# Altium footprint library Transformers.PcbLib: 80 footprints (part 1 of 6)
Each footprint in its own frame and in the unit in brackets; x right, y up, seen from the top. Pads: shape width x height; smd on the part's side, far side on the other; paste and mask are expansions set on the pad; w line width, h text height; cw(c..) or ccw(c..) is an arc to the next point about the centre after c.
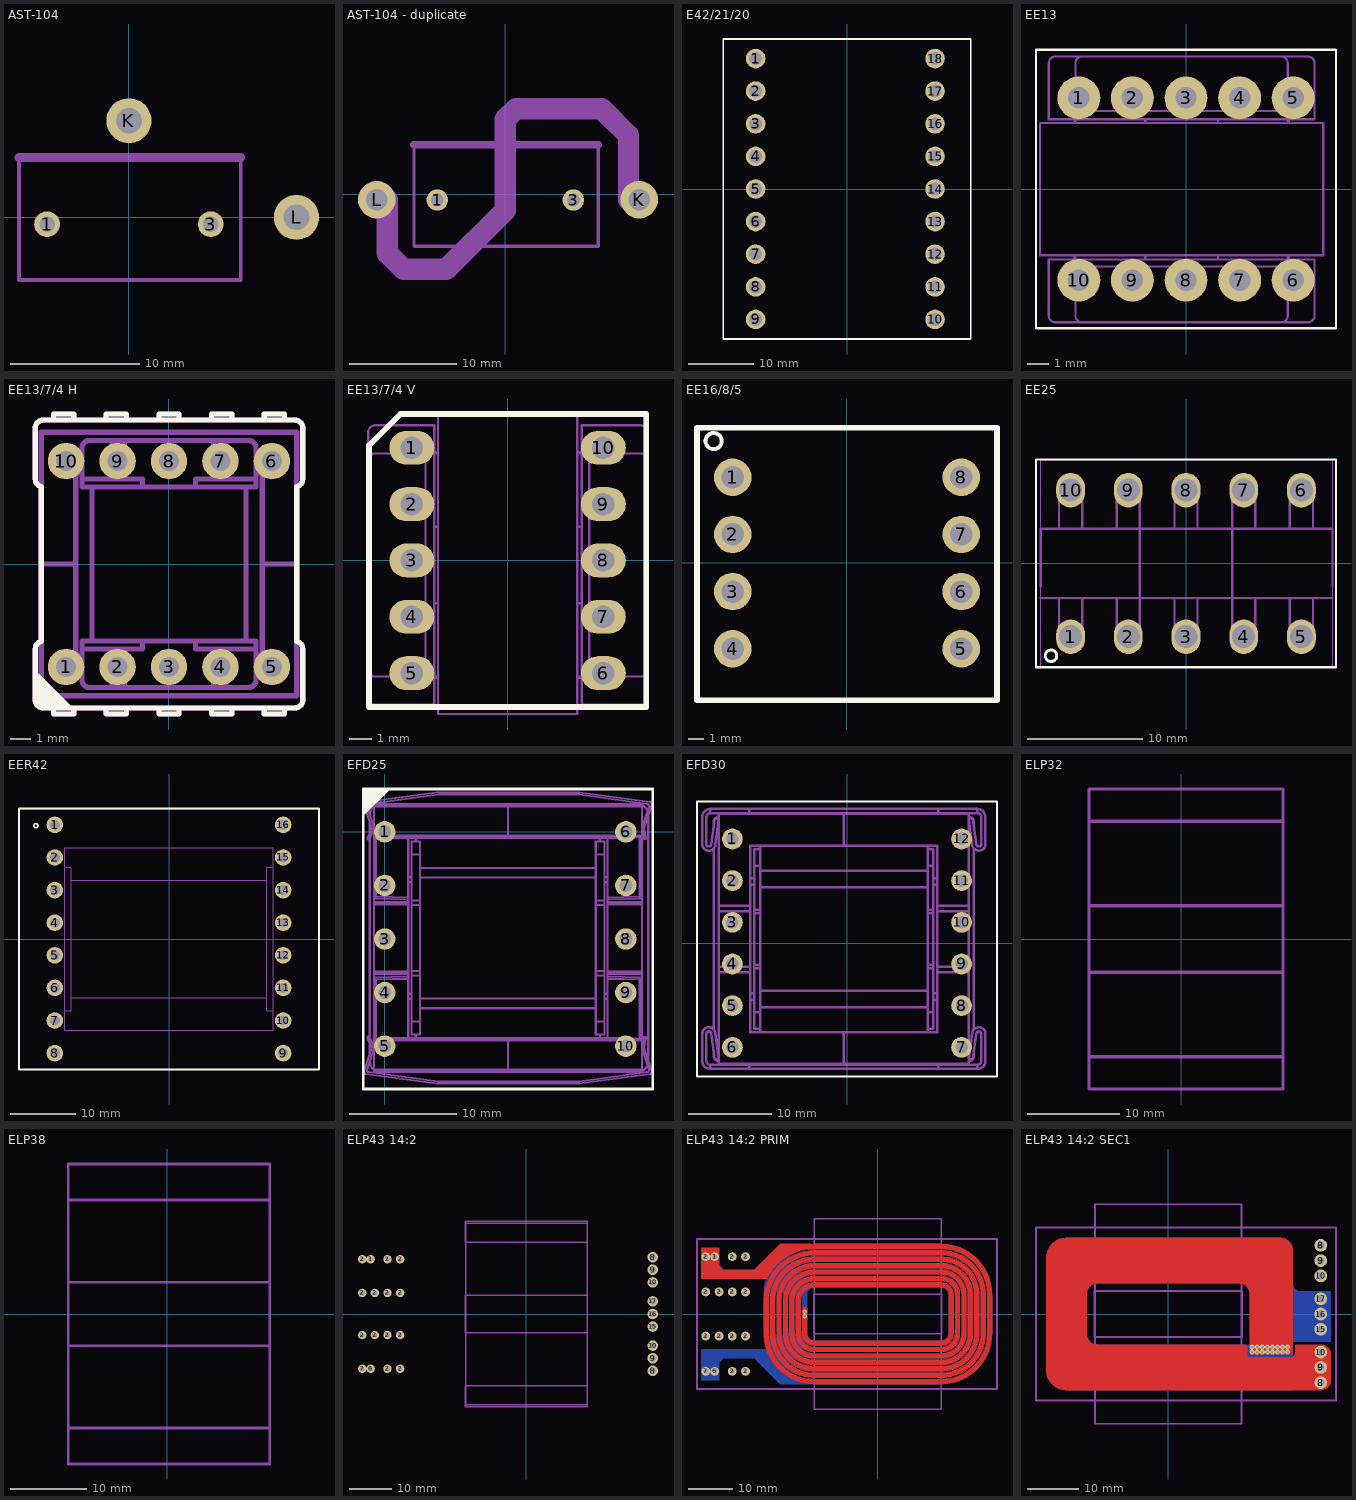
[diagram p0: the footprints below, top view; thin cyan lines are the x and y axes]

## AST-104 [mm]
pads (4):
  round 2 hole 1.2: 1(-6.35,-0.53) 3(6.35,-0.53)
  round 3.5 hole 2: K(0,7.5) L(13,0)
Mechanical 13:
  lines w0.3: -8.525,4.649 -8.525,-4.851 8.675,-4.851 8.675,4.65
  lines w0.7: -8.525,4.65 8.675,4.65
3D body "46722.stp": height 23.6, standoff -0.8, extent -8.526,-4.851 8.674,4.649

## AST-104 - duplicate [mm]
pads (4):
  round 2 hole 1.2: 1(-6.35,-0.53) 3(6.35,-0.53)
  round 3.5 hole 2: K(12.5,-0.5) L(-12,-0.5)
Mechanical 13:
  lines w0.3: -8.525,4.649 -8.525,-4.851 8.675,-4.851 8.675,4.65
  lines w0.7: -8.525,4.65 8.675,4.65
  lines w2: -11,-0.5 -11,-5.5 -9.5,-7 -5.5,-7 0,-1.5 0,7 1,8 9,8 11.5,5.5 11.5,-0.5
3D body "46722.stp": height 23.6, standoff -0.8, extent -8.526,-4.851 8.674,4.649

## E42/21/20 [mm]
pads (18):
  round 3 hole 2: 1(-14,20) 2(-14,15) 3(-14,10) 4(-14,5) 5(-14,0) 6(-14,-5) 7(-14,-10) 8(-14,-15) 9(-14,-20) 10(13.5,-20) 11(13.5,-15) 12(13.5,-10) 13(13.5,-5) 14(13.5,0) 15(13.5,5) 16(13.5,10) 17(13.5,15) 18(13.5,20)
Top Overlay:
  lines w0.254: -19,-23 19,-23 19,23 -19,23 -19,-23
3D body "E42_20-K-V-18P-SS-YW185_zÈo-enie.STEP": height 50.85, standoff -2.45, extent -18.5,-22.65 18.5,22.65

## EE13 [mm]
pads (10):
  round 2 hole 1 unplated paste-25.4: 1(-5,4.25) 2(-2.5,4.25) 3(0,4.25) 4(2.5,4.25) 5(5,4.25) 6(5,-4.25) 7(2.5,-4.25) 8(0,-4.25) 9(-2.5,-4.25) 10(-5,-4.25)
Top Overlay:
  lines w0.1: -7,-6.5 7,-6.5 7,6.5 -7,6.5 -7,-6.5
Mechanical 13:
  lines w0.1: -5.203,-3.092 -5.203,-3.294 -6.403,-3.294 -6.403,-5.919 ccw(c-6.103,-5.919) -6.103,-6.219 -4.853,-6.219 ; -5.203,3.082 -5.203,3.256 -6.403,3.256 -6.403,5.881 cw(c-6.103,5.881) -6.103,6.181 -4.853,6.181 ; -5.153,-3.092 -5.153,-3.294 ; -5.153,3.082 -5.153,3.256 ; -1.903,-3.294 -1.903,-3.092 ; -1.903,3.082 -1.903,3.255 ; 1.497,-3.294 1.497,-3.092 ; 1.497,3.082 1.497,3.255 ; 4.747,-3.092 4.747,-3.294 ; 4.747,3.082 4.747,3.255 ; 4.797,-3.092 4.797,-3.294 5.997,-3.294 5.997,-5.919 cw(c5.697,-5.919) 5.697,-6.219 4.447,-6.219 ; 4.797,3.082 4.797,3.256 5.997,3.256 5.997,5.881 ccw(c5.697,5.881) 5.697,6.181 4.447,6.181 ; -5.153,-3.625 4.747,-3.625 ; -5.153,-3.625 -5.153,-5.919 ccw(c-4.853,-5.919) -4.853,-6.219 ; -5.153,-3.625 -5.153,-3.294 ; -5.153,-3.294 4.747,-3.294 ; -5.153,3.256 -1.903,3.256 ; -5.153,3.256 -5.153,3.644 ; -5.153,3.644 4.747,3.644 ; -5.153,3.644 -5.153,5.881 cw(c-4.853,5.881) -4.853,6.181 ; -4.853,-6.219 4.447,-6.219 ; -4.853,6.181 4.447,6.181 ; -1.903,3.256 1.497,3.256 ; 1.497,3.255 4.747,3.255 ; 4.447,-6.219 ccw(c4.447,-5.919) 4.747,-5.919 4.747,-3.625 ; 4.447,6.181 cw(c4.447,5.881) 4.747,5.881 4.747,3.644 ; 4.747,-3.625 4.747,-3.294 ; 4.747,3.255 4.747,3.644 ; -6.813,-3.092 6.407,-3.092 6.407,3.082 -6.813,3.082 -6.813,-3.092
3D body "User Library-EE13-T304.step": height 12.88, standoff -3.67, extent -6.61,-6.2 6.61,6.2

## EE13/7/4 H [mm]
pads (10):
  round 1.8 hole 1: 1(-5.08,-5.08) 2(-2.54,-5.08) 3(0,-5.08) 4(2.54,-5.08) 5(5.08,-5.08) 6(5.08,5.08) 7(2.54,5.08) 8(0,5.08) 9(-2.54,5.08) 10(-5.08,5.08)
Top Overlay:
  lines w0.254: -6.6,-6.6 -6.1,-7.1 ; -6.6,-6.3 -5.8,-7.1 ; -6.6,-6 -5.5,-7.1 ; -6.6,-5.7 -5.2,-7.1 ; -6.6,-5.4 -4.9,-7.1 ; -6.3,-3.8 -6.3,3.8 ; -6.297,-3.812 ccw(c-6.2,-4.2) -6.6,-4.2 -6.6,-6.7 ccw(c-6.2,-6.7) -6.2,-7.1 6.2,-7.1 ccw(c6.2,-6.7) 6.6,-6.7 6.6,-4.2 ccw(c6.2,-4.2) 6.297,-3.812 ; -6.297,3.812 cw(c-6.2,4.2) -6.6,4.2 -6.6,6.7 cw(c-6.2,6.7) -6.2,7.1 6.2,7.1 cw(c6.2,6.7) 6.6,6.7 6.6,4.2 cw(c6.2,4.2) 6.297,3.812 ; -5.7,-7.1 -5.7,-7.4 -4.7,-7.4 -4.7,-7.1 ; -5.7,7.1 -5.7,7.4 -4.7,7.4 -4.7,7.1 ; -3.1,-7.1 -3.1,-7.4 -2.1,-7.4 -2.1,-7.1 ; -3.1,7.1 -3.1,7.4 -2.1,7.4 -2.1,7.1 ; -0.5,-7.1 -0.5,-7.4 0.5,-7.4 0.5,-7.1 ; -0.5,7.1 -0.5,7.4 0.5,7.4 0.5,7.1 ; 2.1,-7.1 2.1,-7.4 3.1,-7.4 3.1,-7.1 ; 2.1,7.1 2.1,7.4 3.1,7.4 3.1,7.1 ; 4.7,-7.1 4.7,-7.4 5.7,-7.4 5.7,-7.1 ; 4.7,7.1 4.7,7.4 5.7,7.4 5.7,7.1 ; 6.3,-3.8 6.3,3.8
Mechanical 13:
  lines w0.254: -6.3,0 -4.6,0 ; -6.297,-3.812 ccw(c-6.2,-4.2) -6.6,-4.2 -6.6,-6.7 ccw(c-6.2,-6.7) -6.2,-7.1 6.2,-7.1 ccw(c6.2,-6.7) 6.6,-6.7 6.6,-4.2 ccw(c6.2,-4.2) 6.297,-3.812 ; -6.297,3.812 cw(c-6.2,4.2) -6.6,4.2 -6.6,6.7 cw(c-6.2,6.7) -6.2,7.1 6.2,7.1 cw(c6.2,6.7) 6.6,6.7 6.6,4.2 cw(c6.2,4.2) 6.297,3.812 ; -5.7,-7.1 -5.7,-7.4 -4.7,-7.4 -4.7,-7.1 ; -5.7,7.1 -5.7,7.4 -4.7,7.4 -4.7,7.1 ; -4.3,-4.5 -4.6,-4.5 -4.6,4.5 -4.3,4.5 ; -4.3,-4.2 -1.3,-4.2 -1.3,-3.8 ; -4.3,4.2 -1.3,4.2 -1.3,3.8 ; -3.8,-3.8 -3.8,3.8 ; -3.1,-7.1 -3.1,-7.4 -2.1,-7.4 -2.1,-7.1 ; -3.1,7.1 -3.1,7.4 -2.1,7.4 -2.1,7.1 ; -2.8,-6.1 -2.8,-4.2 ; -2.8,4.2 -2.8,6.1 ; -2.2,-6.1 -2.2,-4.2 ; -2.2,4.2 -2.2,6.1 ; -0.5,-7.1 -0.5,-7.4 0.5,-7.4 0.5,-7.1 ; -0.5,7.1 -0.5,7.4 0.5,7.4 0.5,7.1 ; 1.3,-3.8 1.3,-4.2 4.3,-4.2 ; 1.3,3.8 1.3,4.2 4.3,4.2 ; 2.1,-7.1 2.1,-7.4 3.1,-7.4 3.1,-7.1 ; 2.1,7.1 2.1,7.4 3.1,7.4 3.1,7.1 ; 2.2,-6.1 2.2,-4.2 ; 2.2,4.2 2.2,6.1 ; 2.8,-6.1 2.8,-4.2 ; 2.8,4.2 2.8,6.1 ; 3.8,-3.8 3.8,3.8 ; 4.3,-4.5 4.6,-4.5 4.6,4.5 4.3,4.5 ; 4.6,0 6.3,0 ; 4.7,-7.1 4.7,-7.4 5.7,-7.4 5.7,-7.1 ; 4.7,7.1 4.7,7.4 5.7,7.4 5.7,7.1 ; -6.3,-6.5 6.3,-6.5 6.3,6.5 -6.3,6.5 -6.3,-6.5 ; -4.3,-5.7 ccw(c-3.9,-5.7) -3.9,-6.1 3.9,-6.1 ccw(c3.9,-5.7) 4.3,-5.7 4.3,-3.8 -4.3,-3.8 -4.3,-5.7 ; -4.3,3.8 -4.3,5.7 cw(c-3.9,5.7) -3.9,6.1 3.9,6.1 cw(c3.9,5.7) 4.3,5.7 4.3,3.8 -4.3,3.8
  text "1" at -4,-6.4 h2.82
3D body "EF12.6-K-H-10P-P1203_zÈo-enie.STEP": height 9.65, standoff -4.15, extent -6.7,-7.55 6.7,7.55

## EE13/7/4 V [mm]
pads (10):
  oval 2x1.5 hole 1: 1(-4.25,5) 2(-4.25,2.5) 3(-4.25,0) 4(-4.25,-2.5) 5(-4.25,-5) 6(4.25,-5) 7(4.25,-2.5) 8(4.25,0) 9(4.25,2.5) 10(4.25,5)
Top Overlay:
  lines w0.254: -6.15,-6.5 -6.15,5.1 -4.75,6.5 6.15,6.5 6.15,-6.5 -6.15,-6.5
Mechanical 13:
  lines w0.1: -3.082,-5.203 -3.256,-5.203 -3.256,-6.403 -5.881,-6.403 cw(c-5.881,-6.103) -6.181,-6.103 -6.181,-4.853 ; -3.082,-5.153 -3.256,-5.153 ; -3.082,-1.903 -3.256,-1.903 ; -3.082,1.497 -3.256,1.497 ; -3.082,4.747 -3.256,4.747 ; -3.082,4.797 -3.256,4.797 -3.256,5.997 -5.881,5.997 ccw(c-5.881,5.697) -6.181,5.697 -6.181,4.447 ; 3.092,-5.203 3.294,-5.203 3.294,-6.403 5.919,-6.403 ccw(c5.919,-6.103) 6.219,-6.103 6.219,-4.853 ; 3.092,-5.153 3.294,-5.153 ; 3.092,-1.903 3.294,-1.903 ; 3.092,1.497 3.294,1.497 ; 3.092,4.747 3.294,4.747 ; 3.092,4.797 3.294,4.797 3.294,5.997 5.919,5.997 cw(c5.919,5.697) 6.219,5.697 6.219,4.447 ; -6.181,-4.853 ccw(c-5.881,-4.853) -5.881,-5.153 -3.644,-5.153 ; -6.181,-4.853 -6.181,4.447 ; -6.181,4.447 cw(c-5.881,4.447) -5.881,4.747 -3.644,4.747 ; -3.644,-5.153 -3.256,-5.153 ; -3.644,-5.153 -3.644,4.747 ; -3.644,4.747 -3.256,4.747 ; -3.256,-5.153 -3.256,-1.903 ; -3.256,-1.903 -3.256,1.497 ; -3.256,1.497 -3.256,4.747 ; 3.294,-5.153 3.294,4.747 ; 3.294,-5.153 3.624,-5.153 ; 3.294,4.747 3.624,4.747 ; 3.624,-5.153 3.624,4.747 ; 3.624,-5.153 5.919,-5.153 ccw(c5.919,-4.853) 6.219,-4.853 ; 3.624,4.747 5.919,4.747 cw(c5.919,4.447) 6.219,4.447 ; 6.219,-4.853 6.219,4.447 ; -3.082,-6.813 -3.082,6.407 3.092,6.407 3.092,-6.813 -3.082,-6.813
  lines w0.254: -6.15,-6.5 6.15,-6.5 6.15,6.5 -4.75,6.5 -6.15,5.1 -6.15,-6.5
3D body "EE13-K-V-10P-SS_zÈo-enie.STEP": height 14.4, standoff -2.45, extent -6.15,-6.5 6.15,6.5

## EE16/8/5 [mm]
pads (8):
  round 2.5 hole 1.5: 1(-7.62,5.715) 2(-7.62,1.905) 3(-7.62,-1.905) 4(-7.62,-5.715) 5(7.62,-5.715) 6(7.62,-1.905) 7(7.62,1.905) 8(7.62,5.715)
Top Overlay:
  circle w0.254: c-8.89,8.128 r0.539
  lines w0.381: -10,-9.149 10,-9.149 10,9.017 -10,9.017 -10,-9.149
Mechanical 13:
  circle w0.254: c-8.89,8.128 r0.539
  lines w0.1: -10,-9.152 -10,9.014 10,9.014 10,-9.152 -10,-9.152
3D body "User Library-Ensamblaje trafo 16-8-5.STEP": height 14.97, standoff -1.73, extent -10,-9.152 10,9.011

## EE25 [mm]
pads (10):
  oval 2.5x3 hole 2: 1(-10,-6.35) 2(-5,-6.35) 3(0,-6.35) 4(5,-6.35) 5(10,-6.35) 6(10,6.35) 7(5,6.35) 8(0,6.35) 9(-5,6.35) 10(-10,6.35)
Top Overlay:
  circle w0.254: c-11.7,-8 r0.5
  lines w0.2: -13,-9 13,-9 13,9 -13,9 -13,-9
Mechanical 13:
  lines w0.1: -12.7,-9 12.7,-9 12.7,9 -12.6,9 -12.6,-9.1
  lines w0.2: -12.6,-3 12.7,-3 ; -12.6,-2 -12.6,3 12.7,3 12.7,-2 ; -11,-3 -11,-6 -9,-6 -9,-3 ; -11,3 -11,6 -9,6 -9,3 ; -6,-3 -6,-6 -4,-6 -4,-3 ; -6,3 -6,6 -4,6 -4,3 -4,-3 ; -1,-3 -1,-6 1,-6 1,-3 ; -1,3 -1,6 1,6 1,3 ; 6,-3 6,-6 4,-6 4,-3 ; 6,3 6,6 4,6 4,3 4,-3 ; 9,-3 9,-6 11,-6 11,-3 ; 9,3 9,6 11,6 11,3 ; -4,-3 4,-3
3D body "User Library-Trafo EE25.step": height 32.35, standoff -3.5, extent -12.7,-9 12.7,9

## EER42 [mm]
pads (16):
  round 2.54 hole 1.5: 1(-17.5,17.5) 2(-17.5,12.5) 3(-17.5,7.5) 4(-17.5,2.5) 5(-17.5,-2.5) 6(-17.5,-7.5) 7(-17.5,-12.5) 8(-17.5,-17.5) 9(17.5,-17.5) 10(17.5,-12.5) 11(17.5,-7.5) 12(17.5,-2.5) 13(17.5,2.5) 14(17.5,7.5) 15(17.5,12.5) 16(17.5,17.5)
Top Overlay:
  circle w0.254: c-20.408,17.376 r0.316
  lines w0.254: -23,-20 23,-20 23,20 -23,20 -23,-20
Mechanical 13:
  lines w0.178: -16,-11 -15,-11 -15,11 -16,11 ; -15,-9 15,-9 ; -15,9 15,9 ; 16,-11 15,-11 15,11 16,11 ; -23,-20 23,-20 23,20 -23,20 -23,-20 ; -16,-14 16,-14 16,14 -16,14 -16,-14
3D body "User Library-power_transformer.step": height 33.94, standoff -2.5, extent -21.512,-20.193 22.528,19.812

## EFD25 [mm]
pads (10):
  round 2 hole 1.2 unplated paste-25.4: 1(0,0) 2(0,-5) 3(0,-10) 4(0,-15) 5(0,-20) 6(22.5,0) 7(22.5,-5) 8(22.5,-10) 9(22.5,-15) 10(22.5,-20)
Top Overlay:
  region: -2,1.5 0.5,4 -2,4
  lines w0.254: -2,-24 -2,4 25,4 25,-24 -2,-24
Mechanical 13:
  drawing of 1009 lines, arcs and shapes, not listed
3D body "User Library-EFD-25-13-9.step": height 12.9, standoff -3.5, extent -2.134,-23.59 24.734,3.59

## EFD30 [mm]
pads (12):
  round 2.5 hole 1.5 paste-25.4: 1(-13.75,12.5) 2(-13.75,7.5) 3(-13.75,2.5) 4(-13.75,-2.5) 5(-13.75,-7.5) 6(-13.75,-12.5) 7(13.75,-12.5) 8(13.75,-7.5) 9(13.75,-2.5) 10(13.75,2.5) 11(13.75,7.5) 12(13.75,12.5)
Top Overlay:
  lines w0.2: -18,-16 18,-16 18,17 -18,17 -18,-16
Mechanical 13:
  drawing of 172 lines, arcs and shapes, not listed
3D body "User Library-EFD30-1.step": height 16, standoff -0.1, extent -17,-15.6 17,15.6

## ELP32 [mm]
Mechanical 13:
  lines w0.35: -10,-12.75 11,-12.75 ; -10,-3.6 11,-3.6 ; -10,3.6 11,3.6 ; -10,12.75 11,12.75 ; -10,-16.25 -10,16.25 11,16.25 11,-16.25 -10,-16.25

## ELP38 [mm]
Mechanical 13:
  lines w0.35: -13,-15 13.5,-15 ; -13,-4.2 13.5,-4.2 ; -13,4.2 13.5,4.2 ; -13,15 13.5,15 ; -13,-19.75 13.5,-19.75 13.5,0 13.5,19.75 -13,19.75 -13,0 -13,-19.75

## ELP43 14:2 [mm]
pads (25):
  round 2 hole 1: 1(-37,13) 2(-39,13) 2(-39,-5) 2(-39,5) 2(-36,-5) 2(-36,5) 2(-33,-13) 2(-33,13) 2(-33,-5) 2(-33,5) 2(-30,-13) 2(-30,13) 2(-30,-5) 2(-30,5) 6(-37,-13) 7(-39,-13)
  round 2.5 hole 1.5: 8(30,-13.5) 8(30,13.5) 9(30,-10.5) 9(30,10.5) 10(30,-7.5) 10(30,7.5) 15(30,-3) 16(30,0) 17(30,3)
Mechanical 2:
  lines w0.35: -14.5,-22 14.5,-22 14.5,-17 -14.25,-17 -14.5,-17 -14.5,-22 ; -14.5,-4.5 14.5,-4.5 14.5,4.5 -14.5,4.5 -14.5,-4.5 ; -14.5,17 -14.5,22 14.5,22 14.5,17 -14.25,17 -14.5,17
Mechanical 13:
  lines w0.35: -14.4,-21.6 14.4,-21.6 14.4,21.6 -14.4,21.6 -14.4,-21.6
3D body: height 8.3, standoff 4.2, extent -14.4,-21.6 14.4,21.6
3D body: height 4.3, standoff -5.2, extent -14.4,17.35 14.4,21.6
3D body: height 4.3, standoff -5.2, extent -14.4,-4.35 14.4,4.35
3D body: height 4.3, standoff -5.2, extent -14.4,-21.6 14.4,-17.35
3D body: height -1.1, standoff -5.2, extent -14.4,-21.6 14.4,21.6

## ELP43 14:2 PRIM [mm]
pads (16):
  round 2 hole 1: 1(-37,13) 2(-39,13) 2(-39,-5) 2(-39,5) 2(-36,-5) 2(-36,5) 2(-33,-13) 2(-33,13) 2(-33,-5) 2(-33,5) 2(-30,-13) 2(-30,13) 2(-30,-5) 2(-30,5) 6(-37,-13) 7(-39,-13)
via -16.6,-0.5 diameter 1 hole 0.5
via -16.6,0.5 diameter 1 hole 0.5
Top Layer:
  region: -40,15 -36,15 -36,11 -35,10 -28,10 -22.1,15.9 -18.58,15.9 -17.4,15.9 -15.2,15.9 -15.2,15 -18.58,14.72 -23.536,10.944 -24.489,9.621 -25.3,8 -40,8
  lines w1.2: -25.43,8.564 cw(c-14.4,2.946) -14.4,15.324 14.4,15.324 cw(c14.4,4.4) 25.324,4.4 25.324,-4.4 cw(c14.4,-4.4) 14.4,-15.324 -14.4,-15.324 cw(c-14.4,-4.4) -25.324,-4.4 -25.324,0 -25.324,2.946 cw(c-14.4,2.946) -14.4,13.87 14.4,13.87 cw(c14.4,4.4) 23.87,4.4 23.87,-4.4 cw(c14.4,-4.4) 14.4,-13.87 -14.4,-13.87 cw(c-14.4,-4.4) -23.87,-4.4 -23.87,0 -23.87,2.946 cw(c-14.4,2.946) -14.4,12.416 14.4,12.416 cw(c14.4,4.4) 22.416,4.4 22.416,-4.4 cw(c14.4,-4.4) 14.4,-12.416 -14.4,-12.416 cw(c-14.4,-4.4) -22.416,-4.4 -22.416,0 -22.416,2.946 cw(c-14.4,2.946) -14.4,10.962 14.4,10.962 cw(c14.4,4.4) 20.962,4.4 20.962,-4.4 cw(c14.4,-4.4) 14.4,-10.962 -14.4,-10.962 cw(c-14.4,-4.4) -20.962,-4.4 -20.962,0 -20.962,2.946 cw(c-14.4,2.946) -14.4,9.508 14.4,9.508 cw(c14.4,4.4) 19.508,4.4 19.508,-4.4 cw(c14.4,-4.4) 14.4,-9.508 -14.4,-9.508 cw(c-14.4,-4.4) -19.508,-4.4 -19.508,0 -19.508,2.946 cw(c-14.4,2.946) -14.4,8.054 14.4,8.054 cw(c14.4,4.4) 18.054,4.4 18.054,-4.4 cw(c14.4,-4.4) 14.4,-8.054 -14.4,-8.054 cw(c-14.4,-4.4) -18.054,-4.4 -18.054,0 -18.054,2.946 cw(c-14.4,2.946) -14.4,6.6 14.4,6.6 cw(c14.4,4.4) 16.6,4.4 16.6,-4.4 cw(c14.4,-4.4) 14.4,-6.6 -14.4,-6.6 cw(c-14.4,-4.4) -16.6,-4.4 -16.6,1
Bottom Layer:
  region: -40,-15 -36,-15 -36,-11 -35,-10 -28,-10 -22.1,-15.9 -18.58,-15.9 -17.4,-15.9 -15.2,-15.9 -15.2,-15 -18.58,-14.72 -23.536,-10.944 -24.489,-9.621 -25.3,-8 -40,-8
  lines w1.2: -25.43,-8.564 ccw(c-14.4,-2.946) -14.4,-15.324 14.4,-15.324 ccw(c14.4,-4.4) 25.324,-4.4 25.324,4.4 ccw(c14.4,4.4) 14.4,15.324 -14.4,15.324 ccw(c-14.4,4.4) -25.324,4.4 -25.324,0 -25.324,-2.946 ccw(c-14.4,-2.946) -14.4,-13.87 14.4,-13.87 ccw(c14.4,-4.4) 23.87,-4.4 23.87,4.4 ccw(c14.4,4.4) 14.4,13.87 -14.4,13.87 ccw(c-14.4,4.4) -23.87,4.4 -23.87,0 -23.87,-2.946 ccw(c-14.4,-2.946) -14.4,-12.416 14.4,-12.416 ccw(c14.4,-4.4) 22.416,-4.4 22.416,4.4 ccw(c14.4,4.4) 14.4,12.416 -14.4,12.416 ccw(c-14.4,4.4) -22.416,4.4 -22.416,0 -22.416,-2.946 ccw(c-14.4,-2.946) -14.4,-10.962 14.4,-10.962 ccw(c14.4,-4.4) 20.962,-4.4 20.962,4.4 ccw(c14.4,4.4) 14.4,10.962 -14.4,10.962 ccw(c-14.4,4.4) -20.962,4.4 -20.962,0 -20.962,-2.946 ccw(c-14.4,-2.946) -14.4,-9.508 14.4,-9.508 ccw(c14.4,-4.4) 19.508,-4.4 19.508,4.4 ccw(c14.4,4.4) 14.4,9.508 -14.4,9.508 ccw(c-14.4,4.4) -19.508,4.4 -19.508,0 -19.508,-2.946 ccw(c-14.4,-2.946) -14.4,-8.054 14.4,-8.054 ccw(c14.4,-4.4) 18.054,-4.4 18.054,4.4 ccw(c14.4,4.4) 14.4,8.054 -14.4,8.054 ccw(c-14.4,4.4) -18.054,4.4 -18.054,0 -18.054,-2.946 ccw(c-14.4,-2.946) -14.4,-6.6 14.4,-6.6 ccw(c14.4,-4.4) 16.6,-4.4 16.6,4.4 ccw(c14.4,4.4) 14.4,6.6 -14.4,6.6 ccw(c-14.4,4.4) -16.6,4.4 -16.6,-1
Mechanical 2:
  lines w0.35: -41,-17 27,-17 27,17 -41,17 -41,-17 ; -14.5,-4.5 -14.5,4.5 14.5,4.5 14.5,-4.5 -14.5,-4.5
Mechanical 13:
  lines w0.35: -14.4,-21.6 -14.4,21.6 14.4,21.6 14.4,-21.6 -14.4,-21.6
3D body: height -1.1, standoff -5.2, extent -14.4,-21.6 14.4,21.6
3D body: height 4.3, standoff -5.2, extent -14.4,-21.6 14.4,-17.35
3D body: height 4.3, standoff -5.2, extent -14.4,-4.35 14.4,4.35
3D body: height 4.3, standoff -5.2, extent -14.4,17.35 14.4,21.6
3D body: height 8.3, standoff 4.2, extent -14.4,-21.6 14.4,21.6

## ELP43 14:2 SEC1 [mm]
pads (9):
  round 2.5 hole 1.5: 8(30,-13.5) 8(30,13.5) 9(30,-10.5) 9(30,10.5) 10(30,-7.5) 10(30,7.5) 15(30,-3) 16(30,0) 17(30,3)
via 16.5,-6.5 diameter 1 hole 0.5
via 17.5,-6.5 diameter 1 hole 0.5
via 18.5,-6.5 diameter 1 hole 0.5
via 19.5,-6.5 diameter 1 hole 0.5
via 20.5,-6.5 diameter 1 hole 0.5
via 20.5,-7.5 diameter 1 hole 0.5
via 19.5,-7.5 diameter 1 hole 0.5
via 18.5,-7.5 diameter 1 hole 0.5
via 17.5,-7.5 diameter 1 hole 0.5
via 16.5,-7.5 diameter 1 hole 0.5
via 21.5,-7.5 diameter 1 hole 0.5
via 21.5,-6.5 diameter 1 hole 0.5
via 22.5,-7.5 diameter 1 hole 0.5
via 22.5,-6.5 diameter 1 hole 0.5
via 23.5,-6.5 diameter 1 hole 0.5
via 23.5,-7.5 diameter 1 hole 0.5
Top Layer:
  region: 18,-8 24,-8 24.099,-8 24.283,-7.924 24.424,-7.783 24.5,-7.599 24.5,-7.5 24.5,12.5 24.5,12.746 24.404,13.229 24.215,13.684 23.942,14.094 23.594,14.442 23.184,14.715 22.729,14.904 22.246,15 22,15 17,15 -20,15 -20.262,15 -20.782,14.931 -21.289,14.796 -21.773,14.595 -22.227,14.333 -22.643,14.014 -23.014,13.643 -23.333,13.227 -23.595,12.773 -23.796,12.288 -23.932,11.782 -24,11.262 -24,11 -24,-11 -24,-11.262 -23.932,-11.782 -23.796,-12.289 -23.595,-12.773 -23.333,-13.227 -23.014,-13.643 -22.643,-14.014 -22.227,-14.333 -21.773,-14.595 -21.288,-14.796 -20.782,-14.932 -20.262,-15 -20,-15 16,-15 22,-15 30,-15 30.197,-15 30.583,-14.923 30.947,-14.772 31.275,-14.554 31.554,-14.275 31.772,-13.947 31.923,-13.583 32,-13.197 32,-13 32,-8 32,-7.803 31.923,-7.417 31.772,-7.053 31.554,-6.725 31.275,-6.446 30.947,-6.228 30.583,-6.077 30.197,-6 30,-6 27,-6 25,-6 25,-7.5 24.995,-7.598 24.957,-7.79 24.882,-7.971 24.773,-8.134 24.634,-8.273 24.471,-8.382 24.29,-8.457 24.098,-8.495 24,-8.5 23.5,-8.5 21,-8.5 16,-8.5 15.902,-8.49 15.722,-8.416 15.584,-8.278 15.51,-8.098 15.5,-8 15.5,-6.5 15.5,-6.401 15.424,-6.217 15.283,-6.076 15.1,-6 15,-6 -14,-6 -14.196,-5.99 -14.581,-5.914 -14.943,-5.764 -15.269,-5.546 -15.546,-5.269 -15.764,-4.943 -15.914,-4.581 -15.99,-4.196 -16,-4 -16,4 -15.99,4.196 -15.914,4.581 -15.764,4.943 -15.546,5.269 -15.269,5.546 -14.943,5.764 -14.581,5.914 -14.196,5.99 -14,6 14,6 14.196,5.99 14.581,5.914 14.943,5.764 15.269,5.546 15.546,5.269 15.764,4.943 15.914,4.581 15.99,4.196 16,4 16,-7.5 16,-7.599 16.076,-7.783 16.217,-7.924 16.4,-8 16.5,-8
Bottom Layer:
  region: 22,15 -20,15 -20.262,15 -20.782,14.932 -21.289,14.796 -21.773,14.595 -22.227,14.333 -22.643,14.014 -23.014,13.643 -23.333,13.227 -23.595,12.773 -23.796,12.289 -23.932,11.782 -24,11.262 -24,11 -24,-11 -24,-11.262 -23.932,-11.782 -23.796,-12.289 -23.595,-12.773 -23.333,-13.227 -23.014,-13.643 -22.643,-14.014 -22.227,-14.333 -21.773,-14.595 -21.289,-14.796 -20.782,-14.932 -20.262,-15 -20,-15 24.5,-15 24.5,-6 -14,-6 -14.196,-5.99 -14.581,-5.914 -14.943,-5.764 -15.269,-5.546 -15.546,-5.269 -15.764,-4.943 -15.914,-4.581 -15.99,-4.196 -16,-4 -16,4 -15.99,4.196 -15.914,4.581 -15.764,4.943 -15.546,5.269 -15.269,5.546 -14.943,5.764 -14.581,5.914 -14.196,5.99 -14,6 14,6 14.196,5.99 14.581,5.914 14.943,5.764 15.269,5.546 15.546,5.269 15.764,4.943 15.914,4.581 15.99,4.196 16,4 16,-3.5 16,-3.697 16.077,-4.083 16.228,-4.447 16.446,-4.775 16.725,-5.054 17.053,-5.272 17.417,-5.423 17.803,-5.5 18,-5.5 32,-5.5 32,4.5 26,4.5 25.853,4.507 25.565,4.565 25.293,4.677 25.048,4.841 24.84,5.048 24.677,5.293 24.565,5.565 24.507,5.853 24.5,6 24.5,12.5 24.5,12.746 24.404,13.229 24.215,13.684 23.942,14.094 23.594,14.442 23.184,14.715 22.729,14.904 22.246,15
Mechanical 2:
  lines w0.35: -14.5,-17 -14.25,-17 14.5,-17 ; -26,-17 -26,17 14.5,17 33,17 33,-17 -26,-17 ; -14.5,-4.5 14.5,-4.5 14.5,4.5 -14.5,4.5 -14.5,-4.5
Mechanical 13:
  lines w0.35: -14.4,-21.6 14.4,-21.6 14.4,21.6 -14.4,21.6 -14.4,-21.6
3D body: height 8.3, standoff 4.2, extent -14.4,-21.6 14.4,21.6
3D body: height 4.3, standoff -5.2, extent -14.4,17.35 14.4,21.6
3D body: height 4.3, standoff -5.2, extent -14.4,-4.35 14.4,4.35
3D body: height 4.3, standoff -5.2, extent -14.4,-21.6 14.4,-17.35
3D body: height -1.1, standoff -5.2, extent -14.4,-21.6 14.4,21.6